# Altium footprint library Maxwell_LIB.PcbLib: 143 footprints (part 2 of 9)
Each footprint in its own frame and in the unit in brackets; x right, y up, seen from the top. Pads: shape width x height; smd on the part's side, far side on the other; paste and mask are expansions set on the pad; w line width, h text height; cw(c..) or ccw(c..) is an arc to the next point about the centre after c.
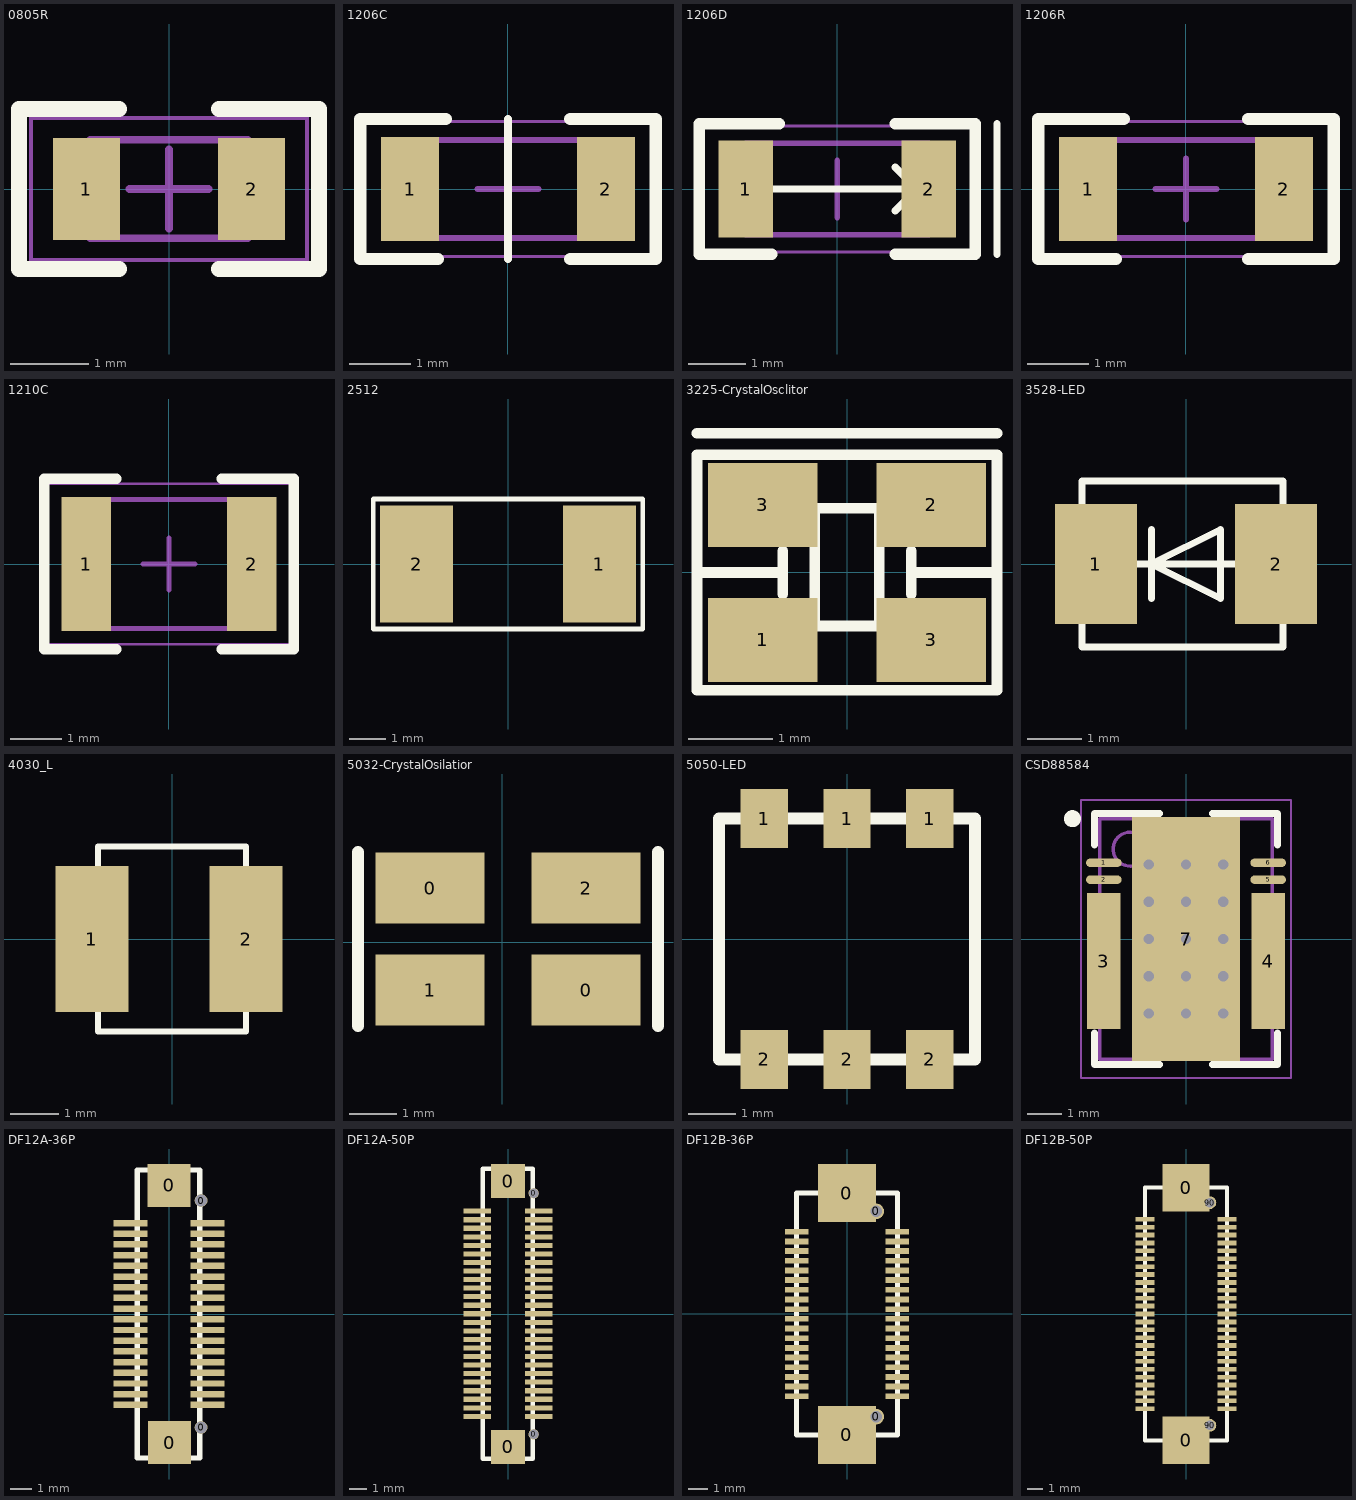
[diagram p1: the footprints below, top view; thin cyan lines are the x and y axes]

## 0805R [mm] "Chip Resistor, 2-Leads, Body 2.00x1.25mm, IPC Medium Density"
height 0.5
pads (2):
  rect 0.85x1.3 smd: 1(-1.05,0) 2(1.05,0)
Top Overlay:
  lines w0.2: -0.635,-1.016 -1.905,-1.016 -1.905,1.016 -0.635,1.016 ; 0.635,-1.016 1.905,-1.016 1.905,1.016 0.635,1.016
Mechanical 13:
  lines w0.1: -1,-0.625 1,-0.625 1,0.625 -1,0.625 -1,-0.625
Mechanical 15:
  lines w0.05: -1.75,-0.9 1.75,-0.9 1.75,0.9 -1.75,0.9 -1.75,-0.9
  lines w0.1: -0.5,0 0.5,0 ; 0,-0.5 0,0.5
3D body: height 0.5, standoff 0, extent 0.508,-0.625 1,0.625
3D body: height 0.5, standoff 0, extent -1,-0.625 -0.508,0.625
3D body: height 0.5, standoff 0, extent -0.508,-0.625 0.508,0.625

## 1206C [mm] "Chip Resistor, 2-Leads, Body 3.20x1.60mm, IPC Medium Density"
height 0.55
pads (2):
  rect 0.95x1.7 smd: 1(-1.6,0) 2(1.6,0)
Top Overlay:
  lines w0.127: 0,-1.143 0,1.143
  lines w0.2: -1.143,-1.143 -2.413,-1.143 -2.413,1.143 -1.016,1.143 ; 1.016,-1.143 2.413,-1.143 2.413,1.143 1.016,1.143
Mechanical 13:
  lines w0.1: -1.6,-0.8 -1.6,0.8 1.6,0.8 1.6,-0.8 -1.6,-0.8
Mechanical 15:
  lines w0.05: -2.35,-1.1 -2.35,1.1 2.35,1.1 2.35,-1.1 -2.35,-1.1
  lines w0.1: -0.5,0 0.5,0 ; 0,-0.5 0,0.5
3D body: height 1.6, standoff 0, extent -1.1,-0.8 1.1,0.8
3D body: height 1.6, standoff 0, extent -1.6,-0.8 -1.1,0.8
3D body: height 1.6, standoff 0, extent 1.1,-0.8 1.6,0.8

## 1206D [mm] "Chip Resistor, 2-Leads, Body 3.20x1.60mm, IPC Medium Density"
height 0.55
pads (2):
  rect 0.95x1.7 smd: 1(-1.6,0) 2(1.6,0)
Top Overlay:
  lines w0.127: -1.27,0 1.397,0 ; 1.016,-0.381 1.397,0 ; 1.016,0.381 1.397,0 ; 2.794,-1.143 2.794,1.143
  lines w0.2: -1.143,-1.143 -2.413,-1.143 -2.413,1.143 -1.016,1.143 ; 1.016,-1.143 2.413,-1.143 2.413,1.143 1.016,1.143
Mechanical 13:
  lines w0.1: -1.6,-0.8 -1.6,0.8 1.6,0.8 1.6,-0.8 -1.6,-0.8
Mechanical 15:
  lines w0.05: -2.35,-1.1 -2.35,1.1 2.35,1.1 2.35,-1.1 -2.35,-1.1
  lines w0.1: -0.5,0 0.5,0 ; 0,-0.5 0,0.5
3D body: height 1.6, standoff 0, extent -1.1,-0.8 1.1,0.8
3D body: height 1.6, standoff 0, extent -1.6,-0.8 -1.1,0.8
3D body: height 1.6, standoff 0, extent 1.1,-0.8 1.6,0.8

## 1206R [mm] "Chip Resistor, 2-Leads, Body 3.20x1.60mm, IPC Medium Density"
height 0.55
pads (2):
  rect 0.95x1.7 smd: 1(-1.6,0) 2(1.6,0)
Top Overlay:
  lines w0.2: -1.143,-1.143 -2.413,-1.143 -2.413,1.143 -1.016,1.143 ; 1.016,-1.143 2.413,-1.143 2.413,1.143 1.016,1.143
Mechanical 13:
  lines w0.1: -1.6,-0.8 1.6,-0.8 1.6,0.8 -1.6,0.8 -1.6,-0.8
Mechanical 15:
  lines w0.05: -2.35,-1.1 2.35,-1.1 2.35,1.1 -2.35,1.1 -2.35,-1.1
  lines w0.1: -0.5,0 0.5,0 ; 0,-0.5 0,0.5
3D body: height 0.55, standoff 0, extent 1.1,-0.8 1.6,0.8
3D body: height 0.55, standoff 0, extent -1.6,-0.8 -1.1,0.8
3D body: height 0.55, standoff 0, extent -1.1,-0.8 1.1,0.8

## 1210C [mm] "Chip Resistor, 2-Leads, Body 3.20x2.50mm, IPC Medium Density"
height 0.55
pads (2):
  rect 0.95x2.6 smd: 1(-1.6,0) 2(1.6,0)
Top Overlay:
  lines w0.2: -1.016,-1.651 -2.413,-1.651 -2.413,1.651 -1.016,1.651 ; 1.016,-1.651 2.413,-1.651 2.413,1.651 1.016,1.651
Mechanical 13:
  lines w0.1: -1.6,-1.25 1.6,-1.25 1.6,1.25 -1.6,1.25 -1.6,-1.25
Mechanical 15:
  lines w0.05: -2.35,-1.55 2.35,-1.55 2.35,1.55 -2.35,1.55 -2.35,-1.55
  lines w0.1: -0.5,0 0.5,0 ; 0,-0.5 0,0.5
3D body: height 2.5, standoff 0, extent 1.1,-1.25 1.6,1.25
3D body: height 2.5, standoff 0, extent -1.6,-1.25 -1.1,1.25
3D body: height 2.5, standoff 0, extent -1.1,-1.25 1.1,1.25

## 2512 [mm]
pads (2):
  rect 2x3.2 smd: 1(2.5,0) 2(-2.5,0)
Top Overlay:
  lines w0.127: -3.683,-1.778 -3.683,1.778 3.683,1.778 3.683,-1.778 -3.683,-1.778
3D body "CircuitWorks-RESISTOR 2512.STEP": height 0.58, standoff -0.03, extent -3.175,-1.63 3.175,1.63

## 3225-CrystalOsclitor [mm]
pads (4):
  rect 1.3x1 smd: 1(-1,-0.8) 2(1,0.8) 3(-1,0.8) 3(1,-0.8)
Top Overlay:
  lines w0.127: -1.778,0 -0.762,0 ; -1.778,1.651 1.778,1.651 ; -0.762,-0.254 -0.762,0.254 ; 0.762,-0.254 0.762,0.254 ; 0.762,0 1.778,0 ; -1.778,-1.397 -1.778,1.397 1.778,1.397 1.778,-1.397 -1.778,-1.397 ; -0.381,-0.635 0.381,-0.635 0.381,0.762 -0.381,0.762 -0.381,-0.635
3D body "User Library-NX3225GB.STEP": height 0.75, standoff 0, extent -1.6,-1.25 1.6,1.25

## 3528-LED [mm]
pads (2):
  rect 1.5x2.2 smd: 1(-1.651,0) 2(1.651,0)
Top Overlay:
  lines w0.127: -0.889,0 0.889,0 ; -0.635,-0.635 -0.635,0.635 ; -1.905,-1.524 1.778,-1.524 1.778,1.524 -1.905,1.524 -1.905,-1.524 ; -0.635,0 0.635,0.635 0.635,-0.635 -0.635,0
3D body: height 1, standoff 0, extent -2.159,-1.524 -1.397,1.524
3D body "User Library-Led_3528_SingleColor.STEP": height 1.9, standoff 0, extent -1.75,-1.4 1.75,1.4

## 4030_L [mm]
pads (2):
  rect 1.5x3 smd: 1(-1.651,0) 2(1.524,0)
Top Overlay:
  lines w0.127: -1.524,-1.905 1.524,-1.905 1.524,1.905 -1.524,1.905 -1.524,-1.905
3D body "l4x4.STEP": height 1, standoff -0.02, extent -2.002,-2 2.002,2

## 5032-CrystalOsilatior [mm]
pads (4):
  rect 2.3x1.5 smd: 0(-1.524,1.143) 0(1.778,-1.016) 1(-1.524,-1.016) 2(1.778,1.143)
Top Overlay:
  lines w0.254: -3.048,-1.778 -3.048,1.905 ; 3.302,-1.778 3.302,1.905
3D body "5032.stp": height 1.09, standoff 0, extent -2.5,-1.6 2.5,1.6

## 5050-LED [mm]
pads (6):
  rect 1x1.25 smd: 1(-1.75,2.54) 1(0,2.54) 1(1.75,2.54) 2(-1.75,-2.54) 2(0,-2.54) 2(1.75,-2.54)
Top Overlay:
  lines w0.254: -2.7,-2.54 -2.7,2.54 2.7,2.54 2.7,-2.54 -2.7,-2.54
3D body "LED-5050.STEP": height 1.4, standoff -0.15, extent -2.5,-2.75 2.5,2.75

## CSD88584 [mm] "QFN, 24-Leads, Body 5.00x7.00mm, Pitch 0.50mm, Thermal Pad 3.20x5.20mm, IPC Medium Density"
height 0.8
pads (7):
  oval 1.05x0.25 smd: 1(-2.425,2.25) 2(-2.425,1.75) 5(2.425,1.75) 6(2.425,2.25)
  rect 1x4 smd: 3(-2.425,-0.65) 4(2.425,-0.65)
  rect 3.2x7.2 smd: 7(0,0)
via 1.1,-2.2 diameter 0.5 hole 0.305
via 0,-2.2 diameter 0.5 hole 0.305
via -1.1,-2.2 diameter 0.5 hole 0.305
via 1.1,-1.1 diameter 0.5 hole 0.305
via 0,-1.1 diameter 0.5 hole 0.305
via -1.1,-1.1 diameter 0.5 hole 0.305
via 1.1,0 diameter 0.5 hole 0.305
via 0,0 diameter 0.5 hole 0.305
via -1.1,0 diameter 0.5 hole 0.305
via 1.1,1.1 diameter 0.5 hole 0.305
via 0,1.1 diameter 0.5 hole 0.305
via -1.1,1.1 diameter 0.5 hole 0.305
via 1.1,2.2 diameter 0.5 hole 0.305
via 0,2.2 diameter 0.5 hole 0.305
via -1.1,2.2 diameter 0.5 hole 0.305
Top Overlay:
  circle w0.25: c-3.35,3.55 r0.125
  lines w0.2: -2.7,-2.775 -2.7,-3.7 -0.775,-3.7 ; -2.7,2.775 -2.7,3.7 -0.775,3.7 ; 0.775,-3.7 2.7,-3.7 2.7,-2.775 ; 0.775,3.7 2.7,3.7 2.7,2.775
Mechanical 13:
  circle w0.1: c-1.65,2.65 r0.5
  lines w0.1: -2.55,-3.55 2.55,-3.55 2.55,3.55 -2.55,3.55 -2.55,-3.55
Mechanical 15:
  lines w0.05: -3.1,-4.1 3.1,-4.1 3.1,4.1 -3.1,4.1 -3.1,-4.1
  lines w0.1: -0.5,0 0.5,0 ; 0,-0.5 0,0.5

## DF12A-36P [mm]
pads (40):
  rect 2x2 smd: 0(0,6.02) 0(0.025,-6)
  round 0.6 hole 0.55: 0(1.5,-5.29) 0(1.5,5.31)
  rect 1.6x0.3 smd: 1(-1.8,4.26) 2(-1.8,3.76) 3(-1.8,3.26) 4(-1.8,2.76) 5(-1.8,2.26) 6(-1.8,1.76) 7(-1.8,1.26) 8(-1.8,0.76) 9(-1.8,0.26) 10(-1.8,-0.24) 11(-1.8,-0.74) 12(-1.8,-1.24) 13(-1.8,-1.74) 14(-1.8,-2.24) 15(-1.8,-2.74) 16(-1.8,-3.24) 17(-1.8,-3.74) 18(-1.8,-4.24) 19(1.8,-4.24) 20(1.8,-3.74) 21(1.8,-3.24) 22(1.8,-2.74) 23(1.8,-2.24) 24(1.8,-1.74) 25(1.8,-1.24) 26(1.8,-0.74) 27(1.8,-0.24) 28(1.8,0.26) 29(1.8,0.76) 30(1.8,1.26) 31(1.8,1.76) 32(1.8,2.26) 33(1.8,2.76) 34(1.8,3.26) 35(1.8,3.76) 36(1.8,4.26)
Top Overlay:
  lines w0.254: -1.475,-6.72 -1.475,-5.036 -1.475,4.26 -1.475,6.419 -1.475,6.74 1.446,6.74 1.446,5.784 1.446,-5.036 1.446,-6.72 -1.475,-6.72
3D body "DF12A-36.stp": height 2.7, standoff -0.6, extent -2.3,-6.055 2.3,6.045

## DF12A-50P [mm]
pads (54):
  rect 2x2 smd: 0(0,-7.772) 0(0,7.772)
  round 0.6 hole 0.55: 0(1.5,-7.037) 0(1.5,7.063)
  rect 1.6x0.3 smd: 1(-1.8,6.013) 2(-1.8,5.513) 3(-1.8,5.013) 4(-1.8,4.513) 5(-1.8,4.013) 6(-1.8,3.513) 7(-1.8,3.013) 8(-1.8,2.513) 9(-1.8,2.013) 10(-1.8,1.513) 11(-1.8,1.013) 12(-1.8,0.513) 13(-1.8,0.013) 14(-1.8,-0.487) 15(-1.8,-0.987) 16(-1.8,-1.487) 17(-1.8,-1.987) 18(-1.8,-2.487) 19(-1.8,-2.987) 20(-1.8,-3.487) 21(-1.8,-3.987) 22(-1.8,-4.487) 23(-1.8,-4.987) 24(-1.8,-5.487) 25(-1.8,-5.987) 26(1.8,-5.987) 27(1.8,-5.487) 28(1.8,-4.987) 29(1.8,-4.487) 30(1.8,-3.987) 31(1.8,-3.487) 32(1.8,-2.987) 33(1.8,-2.487) 34(1.8,-1.987) 35(1.8,-1.487) 36(1.8,-0.987) 37(1.8,-0.487) 38(1.8,0.013) 39(1.8,0.513) 40(1.8,1.013) 41(1.8,1.513) 42(1.8,2.013) 43(1.8,2.513) 44(1.8,3.013) 45(1.8,3.513) 46(1.8,4.013) 47(1.8,4.513) 48(1.8,5.013) 49(1.8,5.513) 50(1.8,6.013)
Top Overlay:
  lines w0.254: -1.475,-8.467 1.446,-8.467 1.446,-8.211 1.446,-3.283 1.446,7.537 1.446,8.493 -1.475,8.493 -1.475,8.172 -1.475,6.013 -1.475,-3.283 -1.475,-8.211 -1.475,-8.467
3D body "DF12A-50.stp": height 2.7, standoff -0.6, extent -2.3,-7.825 2.3,7.775

## DF12B-36P [mm]
pads (40):
  rect 3x3 smd: 0(-0.016,-6.258) 0(-0.016,6.242)
  round 0.8 hole 0.6: 0(1.5,-5.308) 0(1.5,5.292)
  rect 1.2x0.3 smd: 1(-2.616,4.242) 2(-2.616,3.742) 3(-2.616,3.242) 4(-2.616,2.742) 5(-2.616,2.242) 6(-2.616,1.742) 7(-2.616,1.242) 8(-2.616,0.742) 9(-2.616,0.242) 10(-2.616,-0.258) 11(-2.616,-0.758) 12(-2.616,-1.258) 13(-2.616,-1.758) 14(-2.616,-2.258) 15(-2.616,-2.758) 16(-2.616,-3.258) 17(-2.616,-3.758) 18(-2.616,-4.258) 19(2.584,-4.258) 20(2.584,-3.758) 21(2.584,-3.258) 22(2.584,-2.758) 23(2.584,-2.258) 24(2.584,-1.758) 25(2.584,-1.258) 26(2.584,-0.758) 27(2.584,-0.258) 28(2.584,0.242) 29(2.584,0.742) 30(2.584,1.242) 31(2.584,1.742) 32(2.584,2.242) 33(2.584,2.742) 34(2.584,3.242) 35(2.584,3.742) 36(2.584,4.242)
Top Overlay:
  lines w0.254: -2.616,-6.258 -2.616,6.242 2.584,6.242 2.584,-6.258 -2.616,-6.258
3D body "DF12B-36p.stp": height 2.25, standoff -0.05, extent -2.317,-5.576 2.291,5.624

## DF12B-50P [mm]
pads (54):
  rect 3x3 smd: 0(-0.016,-7.98) 0(-0.016,8.02)
  rect 1.2x0.3 smd: 1(-2.616,6.02) 2(-2.616,5.52) 3(-2.616,5.02) 4(-2.616,4.52) 5(-2.616,4.02) 6(-2.616,3.52) 7(-2.616,3.02) 8(-2.616,2.52) 9(-2.616,2.02) 10(-2.616,1.52) 11(-2.616,1.02) 12(-2.616,0.52) 13(-2.616,0.02) 14(-2.616,-0.48) 15(-2.616,-0.98) 16(-2.616,-1.48) 17(-2.616,-1.98) 18(-2.616,-2.48) 19(-2.616,-2.98) 20(-2.616,-3.48) 21(-2.616,-3.98) 22(-2.616,-4.48) 23(-2.616,-4.98) 24(-2.616,-5.48) 25(-2.616,-5.98) 26(2.584,-5.98) 27(2.584,-5.48) 28(2.584,-4.98) 29(2.584,-4.48) 30(2.584,-3.98) 31(2.584,-3.48) 32(2.584,-2.98) 33(2.584,-2.48) 34(2.584,-1.98) 35(2.584,-1.48) 36(2.584,-0.98) 37(2.584,-0.48) 38(2.584,0.02) 39(2.584,0.52) 40(2.584,1.02) 41(2.584,1.52) 42(2.584,2.02) 43(2.584,2.52) 44(2.584,3.02) 45(2.584,3.52) 46(2.584,4.02) 47(2.584,4.52) 48(2.584,5.02) 49(2.584,5.52) 50(2.584,6.02)
  round 0.8 hole 0.6: 90(1.5,-7.03) 90(1.5,7.07)
Top Overlay:
  lines w0.254: -2.616,-7.98 2.584,-7.98 2.584,8.02 -2.616,8.02 -2.616,-7.929 -2.565,-7.98
3D body "DF12B-50p.stp": height 2.3, standoff 0, extent -2.292,-7.354 2.316,7.346